# Altium footprint library Reflow3D1411sep.PcbLib: 657 footprints (part 30 of 42)
Each footprint in its own frame and in the unit in brackets; x right, y up, seen from the top. Pads: shape width x height; smd on the part's side, far side on the other; paste and mask are expansions set on the pad; w line width, h text height; cw(c..) or ccw(c..) is an arc to the next point about the centre after c.
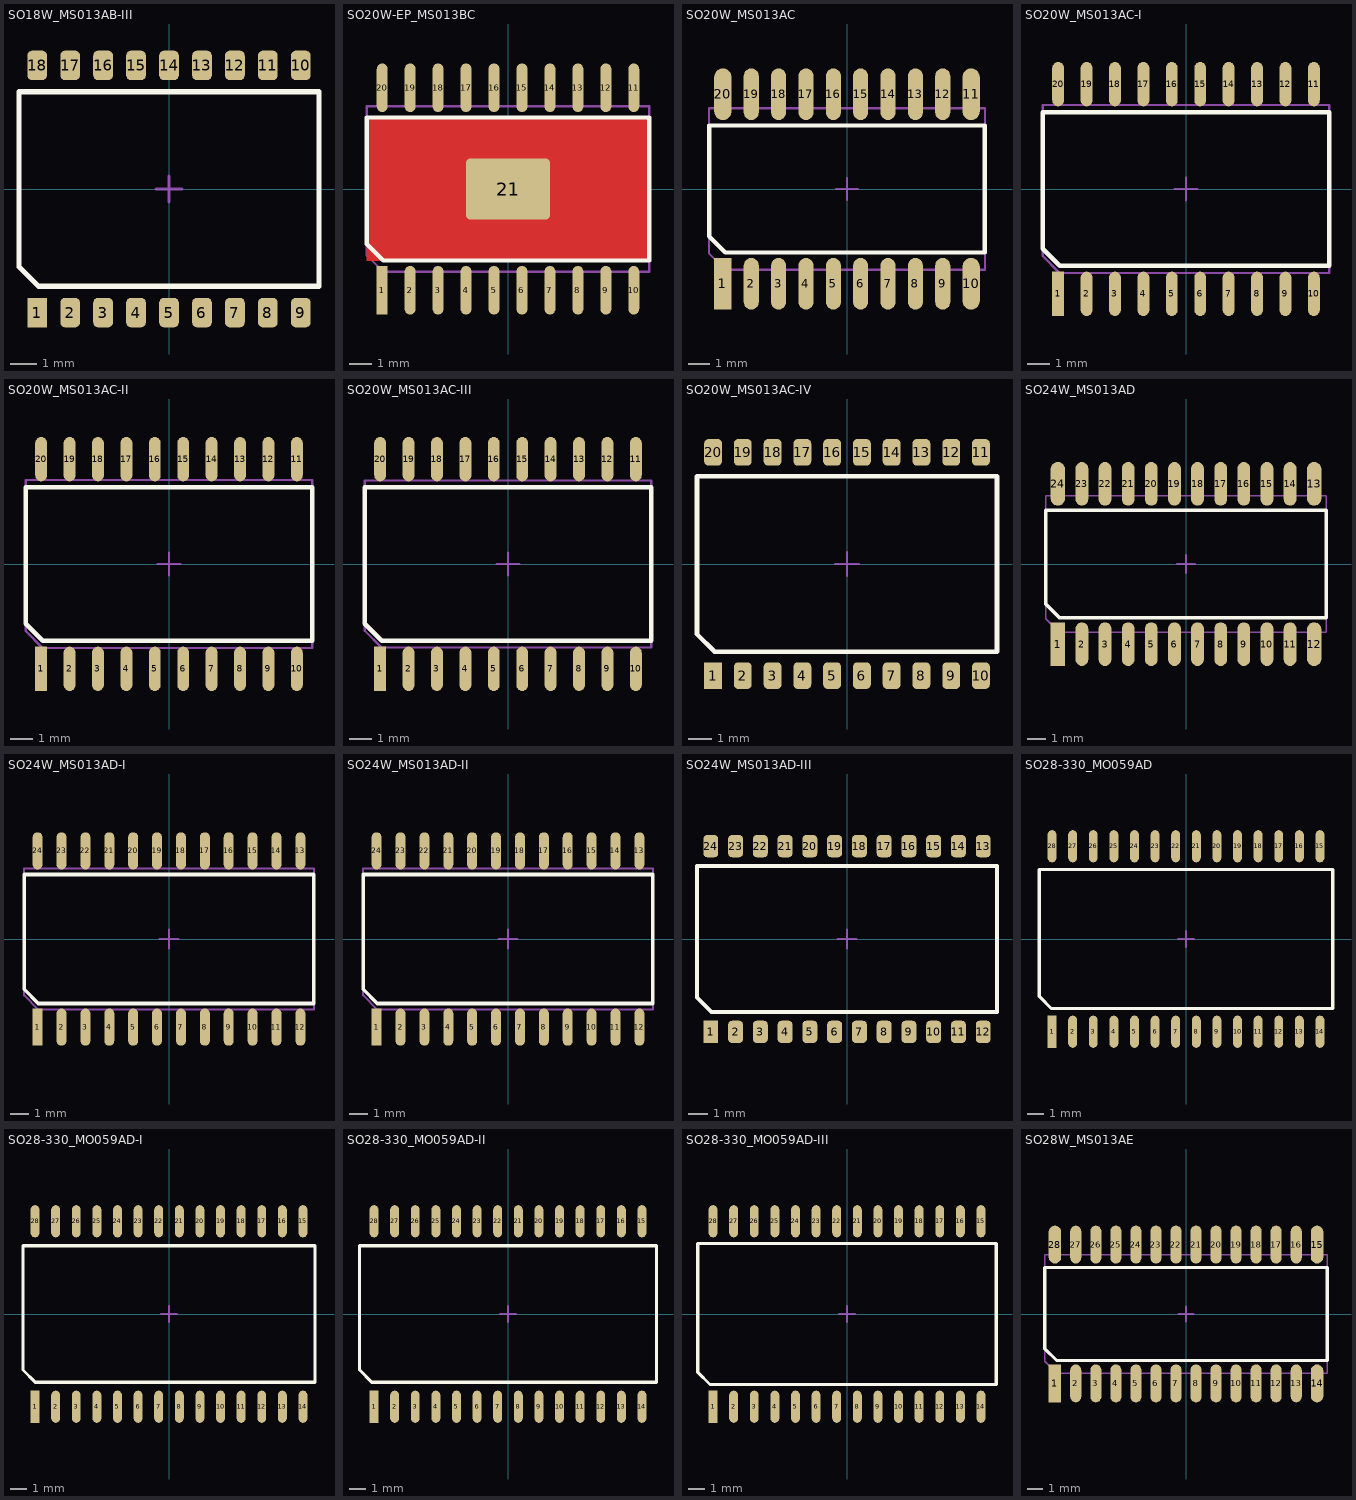
[diagram p29: the footprints below, top view; thin cyan lines are the x and y axes]

## SO18W_MS013AB-III [mm] "www.linear.com, SO_18_05-08-1620.pdf"
height 2.5
pads (18):
  rect 0.76x1.14 smd mask+0.075: 1(-5.08,-4.763)
  rrect50% 0.76x1.14 smd mask+0.075: 2(-3.81,-4.763) 3(-2.54,-4.763) 4(-1.27,-4.763) 5(0,-4.763) 6(1.27,-4.763) 7(2.54,-4.763) 8(3.81,-4.763) 9(5.08,-4.763) 10(5.08,4.763) 11(3.81,4.763) 12(2.54,4.763) 13(1.27,4.763) 14(0,4.763) 15(-1.27,4.763) 16(-2.54,4.763) 17(-3.81,4.763) 18(-5.08,4.763)
Top Overlay:
  lines w0.2: -5.78,-2.995 -5.78,3.745 5.78,3.745 5.78,-3.745 -5.03,-3.745 -5.78,-2.995
Mechanical 13:
  lines w0.1: -5.78,-2.995 -5.78,3.745 5.78,3.745 5.78,-3.745 -5.03,-3.745 -5.78,-2.995
Mechanical 15:
  lines w0.1: -0.5,0 0.5,0 ; 0,-0.5 0,0.5
3D body: height 2.64, standoff 0, extent -5.88,-3.8 5.88,3.8

## SO20W-EP_MS013BC [mm] "www.ti.com, tpa6120a2.pdf"
height 2.4
pads (21):
  rect 0.5x2.2 smd mask+0.075: 1(-5.715,-4.6)
  oval 0.5x2.2 smd mask+0.075: 2(-4.445,-4.6) 3(-3.175,-4.6) 4(-1.905,-4.6) 5(-0.635,-4.6) 6(0.635,-4.6) 7(1.905,-4.6) 8(3.175,-4.6) 9(4.445,-4.6) 10(5.715,-4.6) 11(5.715,4.6) 12(4.445,4.6) 13(3.175,4.6) 14(1.905,4.6) 15(0.635,4.6) 16(-0.635,4.6) 17(-1.905,4.6) 18(-3.175,4.6) 19(-4.445,4.6) 20(-5.715,4.6)
  rrect15% 3.81x2.79 smd mask+0: 21(0,0)
Top Layer:
  region: -6.415,3.25 6.415,3.25 6.415,-3.25 -6.415,-3.25
Top Overlay:
  lines w0.2: -6.415,-2.5 -6.415,3.25 6.415,3.25 6.415,-3.25 -5.665,-3.25 -6.415,-2.5
Mechanical 13:
  lines w0.1: -1.735,-0.675 -1.735,-1.175 -1.235,-1.175 ; -1.735,0.675 -1.735,1.175 -1.235,1.175 ; 1.235,-1.175 1.735,-1.175 1.735,-0.675 ; 1.235,1.175 1.735,1.175 1.735,0.675 ; -6.415,-3.01 -6.415,3.76 6.415,3.76 6.415,-3.76 -5.665,-3.76 -6.415,-3.01
Mechanical 15:
  lines w0.1: -0.5,0 0.5,0 ; 0,-0.5 0,0.5
3D body: height 2.65, standoff 0, extent -6.475,-3.795 6.475,3.795

## SO20W_MS013AC [mm] "www.nxp.com, SOT163-1.pdf, SOT163-1_fp.pdf"
height 2.5
pads (20):
  rect 0.8x2.4 smd mask+0.075: 1(-5.765,-4.4)
  oval 0.7x2.4 smd mask+0.075: 2(-4.445,-4.4) 3(-3.175,-4.4) 4(-1.905,-4.4) 5(-0.635,-4.4) 6(0.635,-4.4) 7(1.905,-4.4) 8(3.175,-4.4) 9(4.445,-4.4) 12(4.445,4.4) 13(3.175,4.4) 14(1.905,4.4) 15(0.635,4.4) 16(-0.635,4.4) 17(-1.905,4.4) 18(-3.175,4.4) 19(-4.445,4.4)
  oval 0.8x2.4 smd mask+0.075: 10(5.765,-4.4) 11(5.765,4.4) 20(-5.765,4.4)
Top Overlay:
  lines w0.2: -6.4,-2.2 -6.4,2.95 6.4,2.95 6.4,-2.95 -5.65,-2.95 -6.4,-2.2
Mechanical 13:
  lines w0.1: -6.4,-3 -6.4,3.75 6.4,3.75 6.4,-3.75 -5.65,-3.75 -6.4,-3
Mechanical 15:
  lines w0.1: -0.5,0 0.5,0 ; 0,-0.5 0,0.5
3D body: height 2.65, standoff 0, extent -6.5,-3.8 6.5,3.8

## SO20W_MS013AC-I [mm] "www.allegromicro.com, pkgso1.pdf; www.maxim-ic.com, 90-0108.PDF; www.jedec.org, MS-013E.pdf"
height 2.4
pads (20):
  rect 0.53x1.98 smd mask+0.075: 1(-5.715,-4.685)
  oval 0.53x1.98 smd mask+0.075: 2(-4.445,-4.685) 3(-3.175,-4.685) 4(-1.905,-4.685) 5(-0.635,-4.685) 6(0.635,-4.685) 7(1.905,-4.685) 8(3.175,-4.685) 9(4.445,-4.685) 10(5.715,-4.685) 11(5.715,4.685) 12(4.445,4.685) 13(3.175,4.685) 14(1.905,4.685) 15(0.635,4.685) 16(-0.635,4.685) 17(-1.905,4.685) 18(-3.175,4.685) 19(-4.445,4.685) 20(-5.715,4.685)
Top Overlay:
  lines w0.2: -6.4,-2.675 -5.65,-3.425 6.4,-3.425 6.4,3.425 -6.4,3.425 -6.4,-2.675
Mechanical 13:
  lines w0.1: -6.4,-3 -5.65,-3.75 6.4,-3.75 6.4,3.75 -6.4,3.75 -6.4,-3
Mechanical 15:
  lines w0.1: -0.5,0 0.5,0 ; 0,-0.5 0,0.5
3D body: height 2.65, standoff 0, extent -6.5,-3.8 6.5,3.8

## SO20W_MS013AC-II [mm] "www.maxim-ic.com, 21-0042.PDF, 90-0108.PDF"
height 2.5
pads (20):
  rect 0.53x1.98 smd mask+0.075: 1(-5.715,-4.685)
  oval 0.53x1.98 smd mask+0.075: 2(-4.445,-4.685) 3(-3.175,-4.685) 4(-1.905,-4.685) 5(-0.635,-4.685) 6(0.635,-4.685) 7(1.905,-4.685) 8(3.175,-4.685) 9(4.445,-4.685) 10(5.715,-4.685) 11(5.715,4.685) 12(4.445,4.685) 13(3.175,4.685) 14(1.905,4.685) 15(0.635,4.685) 16(-0.635,4.685) 17(-1.905,4.685) 18(-3.175,4.685) 19(-4.445,4.685) 20(-5.715,4.685)
Top Overlay:
  lines w0.2: -6.4,-2.675 -6.4,3.425 6.4,3.425 6.4,-3.425 -5.65,-3.425 -6.4,-2.675
Mechanical 13:
  lines w0.1: -6.4,-3 -6.4,3.75 6.4,3.75 6.4,-3.75 -5.65,-3.75 -6.4,-3
Mechanical 15:
  lines w0.1: -0.5,0 0.5,0 ; 0,-0.5 0,0.5
3D body: height 2.65, standoff 0, extent -6.5,-3.8 6.5,3.8

## SO20W_MS013AC-III [mm] "www.national.com, m20b.pdf; www.maxim-ic.com, 90-0108.PDF"
height 2.55
pads (20):
  rect 0.53x1.98 smd mask+0.075: 1(-5.715,-4.685)
  oval 0.53x1.98 smd mask+0.075: 2(-4.445,-4.685) 3(-3.175,-4.685) 4(-1.905,-4.685) 5(-0.635,-4.685) 6(0.635,-4.685) 7(1.905,-4.685) 8(3.175,-4.685) 9(4.445,-4.685) 10(5.715,-4.685) 11(5.715,4.685) 12(4.445,4.685) 13(3.175,4.685) 14(1.905,4.685) 15(0.635,4.685) 16(-0.635,4.685) 17(-1.905,4.685) 18(-3.175,4.685) 19(-4.445,4.685) 20(-5.715,4.685)
Top Overlay:
  lines w0.2: -6.4,-2.675 -6.4,3.425 6.4,3.425 6.4,-3.425 -5.65,-3.425 -6.4,-2.675
Mechanical 13:
  lines w0.1: -6.4,-2.985 -6.4,3.735 6.4,3.735 6.4,-3.735 -5.65,-3.735 -6.4,-2.985
Mechanical 15:
  lines w0.1: -0.5,0 0.5,0 ; 0,-0.5 0,0.5
3D body: height 2.6, standoff 0, extent -6.5,-3.785 6.5,3.785

## SO20W_MS013AC-IV [mm] "www.linear.com, SO_16_05-08-1620.pdf"
height 2.5
pads (20):
  rect 0.76x1.14 smd mask+0.075: 1(-5.715,-4.763)
  rrect50% 0.76x1.14 smd mask+0.075: 2(-4.445,-4.763) 3(-3.175,-4.763) 4(-1.905,-4.763) 5(-0.635,-4.763) 6(0.635,-4.763) 7(1.905,-4.763) 8(3.175,-4.763) 9(4.445,-4.763) 10(5.715,-4.763) 11(5.715,4.763) 12(4.445,4.763) 13(3.175,4.763) 14(1.905,4.763) 15(0.635,4.763) 16(-0.635,4.763) 17(-1.905,4.763) 18(-3.175,4.763) 19(-4.445,4.763) 20(-5.715,4.763)
Top Overlay:
  lines w0.2: -6.4,-2.995 -5.65,-3.745 6.4,-3.745 6.4,3.745 -6.4,3.745 -6.4,-2.995
Mechanical 13:
  lines w0.1: -6.4,-2.995 -6.4,3.745 6.4,3.745 6.4,-3.745 -5.65,-3.745 -6.4,-2.995
Mechanical 15:
  lines w0.1: -0.5,0 0.5,0 ; 0,-0.5 0,0.5
3D body: height 2.64, standoff 0, extent -6.505,-3.8 6.505,3.8

## SO24W_MS013AD [mm] "www.nxp.com, sot137-1_po.pdf, sot137-1_fr.pdf"
height 2.5
pads (24):
  rect 0.8x2.4 smd mask+0.075: 1(-7.035,-4.4)
  oval 0.7x2.4 smd mask+0.075: 2(-5.715,-4.4) 3(-4.445,-4.4) 4(-3.175,-4.4) 5(-1.905,-4.4) 6(-0.635,-4.4) 7(0.635,-4.4) 8(1.905,-4.4) 9(3.175,-4.4) 10(4.445,-4.4) 11(5.715,-4.4) 14(5.715,4.4) 15(4.445,4.4) 16(3.175,4.4) 17(1.905,4.4) 18(0.635,4.4) 19(-0.635,4.4) 20(-1.905,4.4) 21(-3.175,4.4) 22(-4.445,4.4) 23(-5.715,4.4)
  oval 0.8x2.4 smd mask+0.075: 12(7.035,-4.4) 13(7.035,4.4) 24(-7.035,4.4)
Top Overlay:
  lines w0.2: -7.7,-2.2 -6.95,-2.95 7.7,-2.95 7.7,2.95 -7.7,2.95 -7.7,-2.2
Mechanical 13:
  lines w0.1: -7.7,-3 -6.95,-3.75 7.7,-3.75 7.7,3.75 -7.7,3.75 -7.7,-3
Mechanical 15:
  lines w0.1: -0.5,0 0.5,0 ; 0,-0.5 0,0.5
3D body: height 2.65, standoff 0, extent -7.8,-3.8 7.8,3.8

## SO24W_MS013AD-I [mm] "www.allegromicro.com, pkgso1.pdf; www.maxim-ic.com, 90-0182.PDF; www.jedec.org, MS-013E.pdf"
height 2.4
pads (24):
  rect 0.53x1.98 smd mask+0.075: 1(-6.985,-4.685)
  oval 0.53x1.98 smd mask+0.075: 2(-5.715,-4.685) 3(-4.445,-4.685) 4(-3.175,-4.685) 5(-1.905,-4.685) 6(-0.635,-4.685) 7(0.635,-4.685) 8(1.905,-4.685) 9(3.175,-4.685) 10(4.445,-4.685) 11(5.715,-4.685) 12(6.985,-4.685) 13(6.985,4.685) 14(5.715,4.685) 15(4.445,4.685) 16(3.175,4.685) 17(1.905,4.685) 18(0.635,4.685) 19(-0.635,4.685) 20(-1.905,4.685) 21(-3.175,4.685) 22(-4.445,4.685) 23(-5.715,4.685) 24(-6.985,4.685)
Top Overlay:
  lines w0.2: -7.7,-2.675 -7.7,3.425 7.7,3.425 7.7,-3.425 -6.95,-3.425 -7.7,-2.675
Mechanical 13:
  lines w0.1: -7.7,-3 -7.7,3.75 7.7,3.75 7.7,-3.75 -6.95,-3.75 -7.7,-3
Mechanical 15:
  lines w0.1: -0.5,0 0.5,0 ; 0,-0.5 0,0.5
3D body: height 2.65, standoff 0, extent -7.8,-3.8 7.8,3.8

## SO24W_MS013AD-II [mm] "www.maxim-ic.com, 21-0042.PDF, 90-0182.PDF"
height 2.5
pads (24):
  rect 0.53x1.98 smd mask+0.075: 1(-6.985,-4.685)
  oval 0.53x1.98 smd mask+0.075: 2(-5.715,-4.685) 3(-4.445,-4.685) 4(-3.175,-4.685) 5(-1.905,-4.685) 6(-0.635,-4.685) 7(0.635,-4.685) 8(1.905,-4.685) 9(3.175,-4.685) 10(4.445,-4.685) 11(5.715,-4.685) 12(6.985,-4.685) 13(6.985,4.685) 14(5.715,4.685) 15(4.445,4.685) 16(3.175,4.685) 17(1.905,4.685) 18(0.635,4.685) 19(-0.635,4.685) 20(-1.905,4.685) 21(-3.175,4.685) 22(-4.445,4.685) 23(-5.715,4.685) 24(-6.985,4.685)
Top Overlay:
  lines w0.2: -7.7,-2.675 -6.95,-3.425 7.7,-3.425 7.7,3.425 -7.7,3.425 -7.7,-2.675
Mechanical 13:
  lines w0.1: -7.7,-3 -6.95,-3.75 7.7,-3.75 7.7,3.75 -7.7,3.75 -7.7,-3
Mechanical 15:
  lines w0.1: -0.5,0 0.5,0 ; 0,-0.5 0,0.5
3D body: height 2.65, standoff 0, extent -7.8,-3.8 7.8,3.8

## SO24W_MS013AD-III [mm] "www.linear.com, SO_24_05-08-1620.pdf"
height 2.5
pads (24):
  rect 0.76x1.14 smd mask+0.075: 1(-6.985,-4.763)
  rrect50% 0.76x1.14 smd mask+0.075: 2(-5.715,-4.763) 3(-4.445,-4.763) 4(-3.175,-4.763) 5(-1.905,-4.763) 6(-0.635,-4.763) 7(0.635,-4.763) 8(1.905,-4.763) 9(3.175,-4.763) 10(4.445,-4.763) 11(5.715,-4.763) 12(6.985,-4.763) 13(6.985,4.763) 14(5.715,4.763) 15(4.445,4.763) 16(3.175,4.763) 17(1.905,4.763) 18(0.635,4.763) 19(-0.635,4.763) 20(-1.905,4.763) 21(-3.175,4.763) 22(-4.445,4.763) 23(-5.715,4.763) 24(-6.985,4.763)
Top Overlay:
  lines w0.2: -7.695,-2.995 -6.945,-3.745 7.695,-3.745 7.695,3.745 -7.695,3.745 -7.695,-2.995
Mechanical 13:
  lines w0.1: -7.695,-2.995 -7.695,3.745 7.695,3.745 7.695,-3.745 -6.945,-3.745 -7.695,-2.995
Mechanical 15:
  lines w0.1: -0.5,0 0.5,0 ; 0,-0.5 0,0.5
3D body: height 2.64, standoff 0, extent -7.8,-3.8 7.8,3.8

## SO28-330_MO059AD [mm] "www.maxim-ic.com, 21-0251.PDF, 90-0255.PDF; www.jedec.org, Mo-059b.pdf"
height 2.8
pads (28):
  rect 0.55x1.98 smd mask+0.075: 1(-8.255,-5.715)
  oval 0.55x1.98 smd mask+0.075: 2(-6.985,-5.715) 3(-5.715,-5.715) 4(-4.445,-5.715) 5(-3.175,-5.715) 6(-1.905,-5.715) 7(-0.635,-5.715) 8(0.635,-5.715) 9(1.905,-5.715) 10(3.175,-5.715) 11(4.445,-5.715) 12(5.715,-5.715) 13(6.985,-5.715) 14(8.255,-5.715) 15(8.255,5.715) 16(6.985,5.715) 17(5.715,5.715) 18(4.445,5.715) 19(3.175,5.715) 20(1.905,5.715) 21(0.635,5.715) 22(-0.635,5.715) 23(-1.905,5.715) 24(-3.175,5.715) 25(-4.445,5.715) 26(-5.715,5.715) 27(-6.985,5.715) 28(-8.255,5.715)
Top Overlay:
  lines w0.2: -9.05,-3.535 -8.3,-4.285 9.05,-4.285 9.05,4.285 -9.05,4.285 -9.05,-3.535
Mechanical 13:
  lines w0.1: -9.05,-3.535 -9.05,4.285 9.05,4.285 9.05,-4.285 -8.3,-4.285 -9.05,-3.535
Mechanical 15:
  lines w0.1: -0.5,0 0.5,0 ; 0,-0.5 0,0.5
3D body: height 3.05, standoff 0, extent -9.25,-4.45 9.25,4.45

## SO28-330_MO059AD-I [mm] "www.nxp.com, sot213-1.pdf; www.maxim-ic.com, 90-0255.PDF"
height 2.88
pads (28):
  rect 0.55x1.98 smd mask+0.075: 1(-8.255,-5.715)
  oval 0.55x1.98 smd mask+0.075: 2(-6.985,-5.715) 3(-5.715,-5.715) 4(-4.445,-5.715) 5(-3.175,-5.715) 6(-1.905,-5.715) 7(-0.635,-5.715) 8(0.635,-5.715) 9(1.905,-5.715) 10(3.175,-5.715) 11(4.445,-5.715) 12(5.715,-5.715) 13(6.985,-5.715) 14(8.255,-5.715) 15(8.255,5.715) 16(6.985,5.715) 17(5.715,5.715) 18(4.445,5.715) 19(3.175,5.715) 20(1.905,5.715) 21(0.635,5.715) 22(-0.635,5.715) 23(-1.905,5.715) 24(-3.175,5.715) 25(-4.445,5.715) 26(-5.715,5.715) 27(-6.985,5.715) 28(-8.255,5.715)
Top Overlay:
  lines w0.2: -9,-3.45 -9,4.2 9,4.2 9,-4.2 -8.25,-4.2 -9,-3.45
Mechanical 13:
  lines w0.1: -9,-3.45 -8.25,-4.2 9,-4.2 9,4.2 -9,4.2 -9,-3.45
Mechanical 15:
  lines w0.1: -0.5,0 0.5,0 ; 0,-0.5 0,0.5
3D body: height 3.05, standoff 0, extent -9.1,-4.25 9.1,4.25

## SO28-330_MO059AD-II [mm] "www.ti.com, mpds093.pdf; www.maxim-ic.com, 90-0255.PDF"
height 2.7
pads (28):
  rect 0.55x1.98 smd mask+0.075: 1(-8.255,-5.715)
  oval 0.55x1.98 smd mask+0.075: 2(-6.985,-5.715) 3(-5.715,-5.715) 4(-4.445,-5.715) 5(-3.175,-5.715) 6(-1.905,-5.715) 7(-0.635,-5.715) 8(0.635,-5.715) 9(1.905,-5.715) 10(3.175,-5.715) 11(4.445,-5.715) 12(5.715,-5.715) 13(6.985,-5.715) 14(8.255,-5.715) 15(8.255,5.715) 16(6.985,5.715) 17(5.715,5.715) 18(4.445,5.715) 19(3.175,5.715) 20(1.905,5.715) 21(0.635,5.715) 22(-0.635,5.715) 23(-1.905,5.715) 24(-3.175,5.715) 25(-4.445,5.715) 26(-5.715,5.715) 27(-6.985,5.715) 28(-8.255,5.715)
Top Overlay:
  lines w0.2: -9.15,-3.45 -9.15,4.2 9.15,4.2 9.15,-4.2 -8.4,-4.2 -9.15,-3.45
Mechanical 13:
  lines w0.1: -9.15,-3.45 -9.15,4.2 9.15,4.2 9.15,-4.2 -8.4,-4.2 -9.15,-3.45
Mechanical 15:
  lines w0.1: -0.5,0 0.5,0 ; 0,-0.5 0,0.5
3D body: height 3, standoff 0, extent -9.3,-4.3 9.3,4.3

## SO28-330_MO059AD-III [mm] "www.cypress.com, 51-85058_0B_V.pdf; www.maxim-ic.com, 90-0255.PDF"
height 2.59
pads (28):
  rect 0.55x1.98 smd mask+0.075: 1(-8.255,-5.715)
  oval 0.55x1.98 smd mask+0.075: 2(-6.985,-5.715) 3(-5.715,-5.715) 4(-4.445,-5.715) 5(-3.175,-5.715) 6(-1.905,-5.715) 7(-0.635,-5.715) 8(0.635,-5.715) 9(1.905,-5.715) 10(3.175,-5.715) 11(4.445,-5.715) 12(5.715,-5.715) 13(6.985,-5.715) 14(8.255,-5.715) 15(8.255,5.715) 16(6.985,5.715) 17(5.715,5.715) 18(4.445,5.715) 19(3.175,5.715) 20(1.905,5.715) 21(0.635,5.715) 22(-0.635,5.715) 23(-1.905,5.715) 24(-3.175,5.715) 25(-4.445,5.715) 26(-5.715,5.715) 27(-6.985,5.715) 28(-8.255,5.715)
Top Overlay:
  lines w0.2: -9.195,-3.595 -8.445,-4.345 9.195,-4.345 9.195,4.345 -9.195,4.345 -9.195,-3.595
Mechanical 13:
  lines w0.1: -9.195,-3.595 -9.195,4.345 9.195,4.345 9.195,-4.345 -8.445,-4.345 -9.195,-3.595
Mechanical 15:
  lines w0.1: -0.5,0 0.5,0 ; 0,-0.5 0,0.5
3D body: height 2.79, standoff 0, extent -9.245,-4.395 9.245,4.395

## SO28W_MS013AE [mm] "www.nxp.com, sot136-1_po.pdf, SOT136-1_fp_reflow.pdf"
height 2.5
pads (28):
  rect 0.8x2.4 smd mask+0.075: 1(-8.305,-4.4)
  oval 0.7x2.4 smd mask+0.075: 2(-6.985,-4.4) 3(-5.715,-4.4) 4(-4.445,-4.4) 5(-3.175,-4.4) 6(-1.905,-4.4) 7(-0.635,-4.4) 8(0.635,-4.4) 9(1.905,-4.4) 10(3.175,-4.4) 11(4.445,-4.4) 12(5.715,-4.4) 13(6.985,-4.4) 16(6.985,4.4) 17(5.715,4.4) 18(4.445,4.4) 19(3.175,4.4) 20(1.905,4.4) 21(0.635,4.4) 22(-0.635,4.4) 23(-1.905,4.4) 24(-3.175,4.4) 25(-4.445,4.4) 26(-5.715,4.4) 27(-6.985,4.4)
  oval 0.8x2.4 smd mask+0.075: 14(8.305,-4.4) 15(8.305,4.4) 28(-8.305,4.4)
Top Overlay:
  lines w0.2: -8.95,-2.2 -8.2,-2.95 8.95,-2.95 8.95,2.95 -8.95,2.95 -8.95,-2.2
Mechanical 13:
  lines w0.1: -8.95,-3 -8.2,-3.75 8.95,-3.75 8.95,3.75 -8.95,3.75 -8.95,-3
Mechanical 15:
  lines w0.1: -0.5,0 0.5,0 ; 0,-0.5 0,0.5
3D body: height 2.65, standoff 0, extent -9.05,-3.8 9.05,3.8